# Altium footprint library 13-IC Packages-2smt2e.PcbLib: 86 footprints (part 2 of 6)
Each footprint in its own frame and in the unit in brackets; x right, y up, seen from the top. Pads: shape width x height; smd on the part's side, far side on the other; paste and mask are expansions set on the pad; w line width, h text height; cw(c..) or ccw(c..) is an arc to the next point about the centre after c.
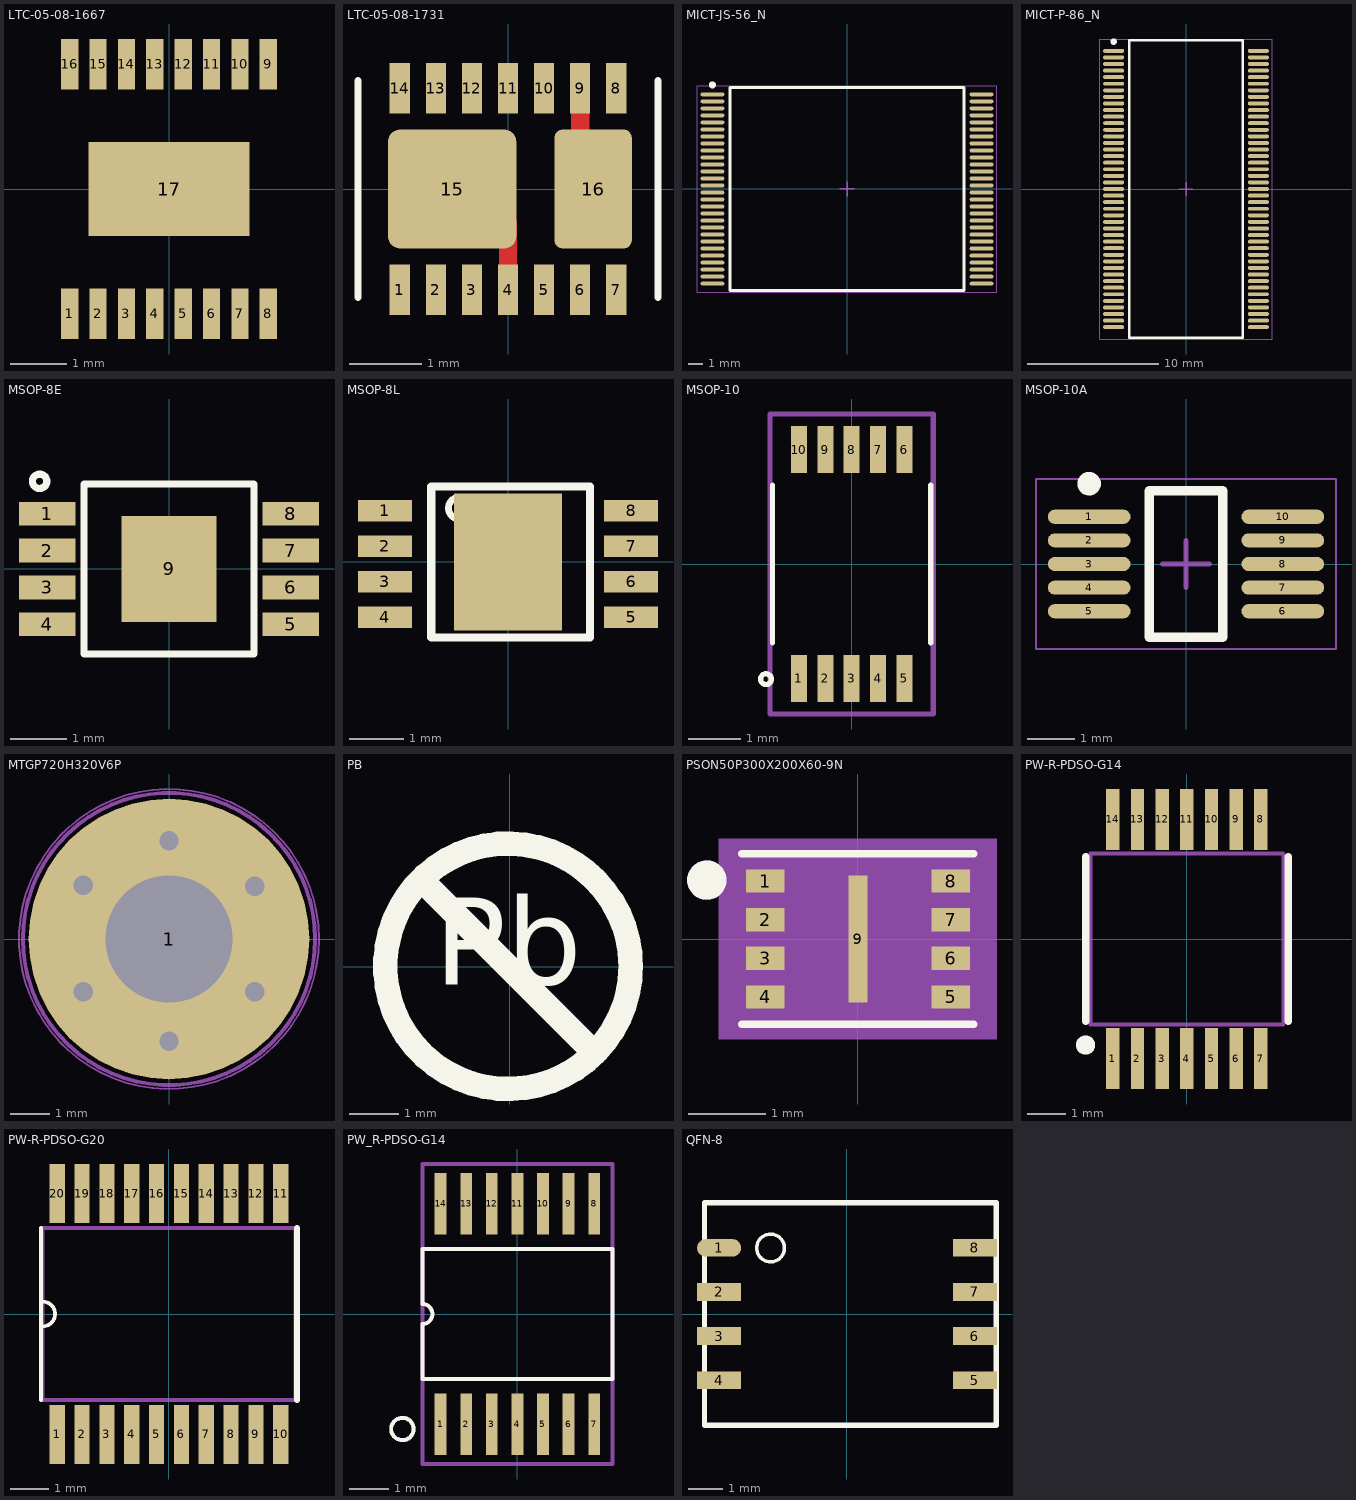
[diagram p1: the footprints below, top view; thin cyan lines are the x and y axes]

## LTC-05-08-1667 [mm] "LTC-3260"
pads (17):
  rect 0.305x0.889 smd mask+0.07: 1(-1.75,-2.2) 2(-1.25,-2.2) 3(-0.75,-2.2) 4(-0.25,-2.2) 5(0.25,-2.2) 6(0.75,-2.2) 7(1.25,-2.2) 8(1.75,-2.2) 9(1.75,2.2) 10(1.25,2.2) 11(0.75,2.2) 12(0.25,2.2) 13(-0.25,2.2) 14(-0.75,2.2) 15(-1.25,2.2) 16(-1.75,2.2)
  rect 2.845x1.651 smd: 17(0,0)
3D body "ltc-05-08-1667.stp": height 0.86, standoff 0, extent -1.968,-2.458 2.032,2.458

## LTC-05-08-1731 [mm]
pads (16):
  rect 0.28x0.7 smd mask+0.07: 1(-1.5,-1.4) 2(-1,-1.4) 3(-0.5,-1.4) 4(0,-1.4) 5(0.5,-1.4) 6(1,-1.4) 7(1.5,-1.4) 8(1.5,1.4) 9(1,1.4) 10(0.5,1.4) 11(0,1.4) 12(-0.5,1.4) 13(-1,1.4) 14(-1.5,1.4)
  rrect20% 1.78x1.65 smd mask+0.07: 15(-0.775,0)
  rrect20% 1.07x1.65 smd: 16(1.181,0)
Top Layer:
  lines w0.254: 0,-1.4 0,-0.47 ; 1,0.635 1,1.4
Top Overlay:
  lines w0.1: -2.08,-1.5 -2.08,1.5 ; 2.08,-1.5 2.08,1.5
3D body "lt3032pad.stp": height 0.02, standoff 0, extent -1.626,-1.753 -1.376,-1.253
3D body "lt3032pad.stp": height 0.02, standoff 0, extent -1.13,-1.753 -0.88,-1.253
3D body "lt3032pad.stp": height 0.02, standoff 0, extent -0.622,-1.753 -0.372,-1.253
3D body "lt3032pad.stp": height 0.02, standoff 0, extent -0.127,-1.753 0.123,-1.253
3D body "lt3032pad.stp": height 0.02, standoff 0, extent 0.381,-1.753 0.631,-1.253
3D body "lt3032pad.stp": height 0.02, standoff 0, extent 0.876,-1.753 1.126,-1.253
3D body "lt3032pad.stp": height 0.02, standoff 0, extent 1.372,-1.753 1.622,-1.253
3D body "lt3032pad.stp": height 0.02, standoff 0, extent 1.376,1.253 1.626,1.753
3D body "lt3032pad.stp": height 0.02, standoff 0, extent 0.868,1.253 1.118,1.753
3D body "lt3032pad.stp": height 0.02, standoff 0, extent 0.372,1.253 0.622,1.753
3D body "lt3032pad.stp": height 0.02, standoff 0, extent -0.123,1.253 0.127,1.753
3D body "lt3032pad.stp": height 0.02, standoff 0, extent -0.618,1.253 -0.368,1.753
3D body "lt3032pad.stp": height 0.02, standoff 0, extent -1.126,1.253 -0.876,1.753
3D body "lt3032pad.stp": height 0.02, standoff 0, extent -1.622,1.253 -1.372,1.753
3D body "lt3032.stp": height 0.8, standoff 0, extent -2,-1.524 2,1.492

## MICT-JS-56_N [mm]
pads (56):
  oval 1.7x0.28 smd: 1(-9.6,6.75) 2(-9.6,6.25) 3(-9.6,5.75) 4(-9.6,5.25) 5(-9.6,4.75) 6(-9.6,4.25) 7(-9.6,3.75) 8(-9.6,3.25) 9(-9.6,2.75) 10(-9.6,2.25) 11(-9.6,1.75) 12(-9.6,1.25) 13(-9.6,0.75) 14(-9.6,0.25) 15(-9.6,-0.25) 16(-9.6,-0.75) 17(-9.6,-1.25) 18(-9.6,-1.75) 19(-9.6,-2.25) 20(-9.6,-2.75) 21(-9.6,-3.25) 22(-9.6,-3.75) 23(-9.6,-4.25) 24(-9.6,-4.75) 25(-9.6,-5.25) 26(-9.6,-5.75) 27(-9.6,-6.25) 28(-9.6,-6.75) 29(9.6,-6.75) 30(9.6,-6.25) 31(9.6,-5.75) 32(9.6,-5.25) 33(9.6,-4.75) 34(9.6,-4.25) 35(9.6,-3.75) 36(9.6,-3.25) 37(9.6,-2.75) 38(9.6,-2.25) 39(9.6,-1.75) 40(9.6,-1.25) 41(9.6,-0.75) 42(9.6,-0.25) 43(9.6,0.25) 44(9.6,0.75) 45(9.6,1.25) 46(9.6,1.75) 47(9.6,2.25) 48(9.6,2.75) 49(9.6,3.25) 50(9.6,3.75) 51(9.6,4.25) 52(9.6,4.75) 53(9.6,5.25) 54(9.6,5.75) 55(9.6,6.25) 56(9.6,6.75)
Top Overlay:
  circle w0.25: c-9.6,7.425 r0.125
  lines w0.2: -8.35,-7.239 -8.35,7.239 8.35,7.239 8.35,-7.239 -8.35,-7.239
Mechanical 15:
  lines w0.05: -10.7,-7.35 -10.7,7.35 10.7,7.35 10.7,-7.35 -10.7,-7.35
  lines w0.1: -0.5,0 0.5,0 ; 0,-0.5 0,0.5
3D body "0_3-1_6.stp": height 0.01, standoff 0, extent 8.801,6.6 10.399,6.9
3D body "0_3-1_6.stp": height 0.01, standoff 0, extent 8.801,6.1 10.399,6.4
3D body "0_3-1_6.stp": height 0.01, standoff 0, extent 8.801,5.6 10.399,5.9
3D body "0_3-1_6.stp": height 0.01, standoff 0, extent 8.801,5.1 10.399,5.4
3D body "0_3-1_6.stp": height 0.01, standoff 0, extent 8.801,4.6 10.399,4.9
3D body "0_3-1_6.stp": height 0.01, standoff 0, extent 8.801,4.1 10.399,4.4
3D body "0_3-1_6.stp": height 0.01, standoff 0, extent 8.801,3.6 10.399,3.9
3D body "0_3-1_6.stp": height 0.01, standoff 0, extent 8.801,3.1 10.399,3.4
3D body "0_3-1_6.stp": height 0.01, standoff 0, extent 8.801,2.6 10.399,2.9
3D body "0_3-1_6.stp": height 0.01, standoff 0, extent 8.801,2.1 10.399,2.4
3D body "0_3-1_6.stp": height 0.01, standoff 0, extent 8.801,1.6 10.399,1.9
3D body "0_3-1_6.stp": height 0.01, standoff 0, extent 8.801,1.1 10.399,1.4
3D body "0_3-1_6.stp": height 0.01, standoff 0, extent 8.801,0.6 10.399,0.9
3D body "0_3-1_6.stp": height 0.01, standoff 0, extent 8.801,0.1 10.399,0.4
3D body "0_3-1_6.stp": height 0.01, standoff 0, extent 8.801,-0.4 10.399,-0.1
3D body "0_3-1_6.stp": height 0.01, standoff 0, extent 8.801,-0.9 10.399,-0.6
3D body "0_3-1_6.stp": height 0.01, standoff 0, extent 8.801,-1.4 10.399,-1.1
3D body "0_3-1_6.stp": height 0.01, standoff 0, extent 8.801,-1.9 10.399,-1.6
3D body "0_3-1_6.stp": height 0.01, standoff 0, extent 8.801,-2.4 10.399,-2.1
3D body "0_3-1_6.stp": height 0.01, standoff 0, extent 8.801,-2.9 10.399,-2.6
3D body "0_3-1_6.stp": height 0.01, standoff 0, extent 8.801,-3.4 10.399,-3.1
3D body "0_3-1_6.stp": height 0.01, standoff 0, extent 8.801,-3.9 10.399,-3.6
3D body "0_3-1_6.stp": height 0.01, standoff 0, extent 8.801,-4.4 10.399,-4.1
3D body "0_3-1_6.stp": height 0.01, standoff 0, extent 8.801,-4.9 10.399,-4.6
3D body "0_3-1_6.stp": height 0.01, standoff 0, extent 8.801,-5.4 10.399,-5.1
3D body "0_3-1_6.stp": height 0.01, standoff 0, extent 8.801,-5.9 10.399,-5.6
3D body "0_3-1_6.stp": height 0.01, standoff 0, extent 8.801,-6.4 10.399,-6.1
3D body "0_3-1_6.stp": height 0.01, standoff 0, extent 8.801,-6.9 10.399,-6.6
3D body "0_3-1_6.stp": height 0.01, standoff 0, extent -10.399,-6.9 -8.801,-6.6
3D body "0_3-1_6.stp": height 0.01, standoff 0, extent -10.399,-6.4 -8.801,-6.1
3D body "0_3-1_6.stp": height 0.01, standoff 0, extent -10.399,-5.9 -8.801,-5.6
3D body "0_3-1_6.stp": height 0.01, standoff 0, extent -10.399,-5.4 -8.801,-5.1
3D body "0_3-1_6.stp": height 0.01, standoff 0, extent -10.399,-4.9 -8.801,-4.6
3D body "0_3-1_6.stp": height 0.01, standoff 0, extent -10.399,-4.4 -8.801,-4.1
3D body "0_3-1_6.stp": height 0.01, standoff 0, extent -10.399,-3.9 -8.801,-3.6
3D body "0_3-1_6.stp": height 0.01, standoff 0, extent -10.399,-3.4 -8.801,-3.1
3D body "0_3-1_6.stp": height 0.01, standoff 0, extent -10.399,-2.9 -8.801,-2.6
3D body "0_3-1_6.stp": height 0.01, standoff 0, extent -10.399,-2.4 -8.801,-2.1
3D body "0_3-1_6.stp": height 0.01, standoff 0, extent -10.399,-1.9 -8.801,-1.6
3D body "0_3-1_6.stp": height 0.01, standoff 0, extent -10.399,-1.4 -8.801,-1.1
3D body "0_3-1_6.stp": height 0.01, standoff 0, extent -10.399,-0.9 -8.801,-0.6
3D body "0_3-1_6.stp": height 0.01, standoff 0, extent -10.399,-0.4 -8.801,-0.1
3D body "0_3-1_6.stp": height 0.01, standoff 0, extent -10.399,0.1 -8.801,0.4
3D body "0_3-1_6.stp": height 0.01, standoff 0, extent -10.399,0.6 -8.801,0.9
3D body "0_3-1_6.stp": height 0.01, standoff 0, extent -10.399,1.1 -8.801,1.4
3D body "0_3-1_6.stp": height 0.01, standoff 0, extent -10.399,1.6 -8.801,1.9
3D body "0_3-1_6.stp": height 0.01, standoff 0, extent -10.399,2.1 -8.801,2.4
3D body "0_3-1_6.stp": height 0.01, standoff 0, extent -10.399,2.6 -8.801,2.9
3D body "0_3-1_6.stp": height 0.01, standoff 0, extent -10.399,3.1 -8.801,3.4
3D body "0_3-1_6.stp": height 0.01, standoff 0, extent -10.399,3.6 -8.801,3.9
3D body "0_3-1_6.stp": height 0.01, standoff 0, extent -10.399,4.1 -8.801,4.4
3D body "0_3-1_6.stp": height 0.01, standoff 0, extent -10.399,4.6 -8.801,4.9
3D body "0_3-1_6.stp": height 0.01, standoff 0, extent -10.399,5.1 -8.801,5.4
3D body "0_3-1_6.stp": height 0.01, standoff 0, extent -10.399,5.6 -8.801,5.9
3D body "0_3-1_6.stp": height 0.01, standoff 0, extent -10.399,6.1 -8.801,6.4
3D body "0_3-1_6.stp": height 0.01, standoff 0, extent -10.399,6.6 -8.801,6.9
3D body "mict-p33256js-56.stp": height 1.01, standoff -0.03, extent -10.254,-7 10.254,7

## MICT-P-86_N [mm]
pads (86):
  oval 1.6x0.3 smd: 1(-5.5,10.5) 2(-5.5,10) 3(-5.5,9.5) 4(-5.5,9) 5(-5.5,8.5) 6(-5.5,8) 7(-5.5,7.5) 8(-5.5,7) 9(-5.5,6.5) 10(-5.5,6) 11(-5.5,5.5) 12(-5.5,5) 13(-5.5,4.5) 14(-5.5,4) 15(-5.5,3.5) 16(-5.5,3) 17(-5.5,2.5) 18(-5.5,2) 19(-5.5,1.5) 20(-5.5,1) 21(-5.5,0.5) 22(-5.5,0) 23(-5.5,-0.5) 24(-5.5,-1) 25(-5.5,-1.5) 26(-5.5,-2) 27(-5.5,-2.5) 28(-5.5,-3) 29(-5.5,-3.5) 30(-5.5,-4) 31(-5.5,-4.5) 32(-5.5,-5) 33(-5.5,-5.5) 34(-5.5,-6) 35(-5.5,-6.5) 36(-5.5,-7) 37(-5.5,-7.5) 38(-5.5,-8) 39(-5.5,-8.5) 40(-5.5,-9) 41(-5.5,-9.5) 42(-5.5,-10) 43(-5.5,-10.5) 44(5.5,-10.5) 45(5.5,-10) 46(5.5,-9.5) 47(5.5,-9) 48(5.5,-8.5) 49(5.5,-8) 50(5.5,-7.5) 51(5.5,-7) 52(5.5,-6.5) 53(5.5,-6) 54(5.5,-5.5) 55(5.5,-5) 56(5.5,-4.5) 57(5.5,-4) 58(5.5,-3.5) 59(5.5,-3) 60(5.5,-2.5) 61(5.5,-2) 62(5.5,-1.5) 63(5.5,-1) 64(5.5,-0.5) 65(5.5,0) 66(5.5,0.5) 67(5.5,1) 68(5.5,1.5) 69(5.5,2) 70(5.5,2.5) 71(5.5,3) 72(5.5,3.5) 73(5.5,4) 74(5.5,4.5) 75(5.5,5) 76(5.5,5.5) 77(5.5,6) 78(5.5,6.5) 79(5.5,7) 80(5.5,7.5) 81(5.5,8) 82(5.5,8.5) 83(5.5,9) 84(5.5,9.5) 85(5.5,10) 86(5.5,10.5)
Top Overlay:
  circle w0.25: c-5.5,11.2 r0.125
  lines w0.2: -4.3,-11.303 4.3,-11.303 4.3,11.303 -4.3,11.303 -4.3,-11.303
Mechanical 15:
  lines w0.05: -6.55,-11.4 6.55,-11.4 6.55,11.4 -6.55,11.4 -6.55,-11.4
  lines w0.1: -0.5,0 0.5,0 ; 0,-0.5 0,0.5
3D body "0_3-1_6.stp": height 0.01, standoff 0, extent 4.701,10.35 6.299,10.65
3D body "0_3-1_6.stp": height 0.01, standoff 0, extent 4.701,9.85 6.299,10.15
3D body "0_3-1_6.stp": height 0.01, standoff 0, extent 4.701,9.35 6.299,9.65
3D body "0_3-1_6.stp": height 0.01, standoff 0, extent 4.701,8.85 6.299,9.15
3D body "0_3-1_6.stp": height 0.01, standoff 0, extent 4.701,8.35 6.299,8.65
3D body "0_3-1_6.stp": height 0.01, standoff 0, extent 4.701,7.85 6.299,8.15
3D body "0_3-1_6.stp": height 0.01, standoff 0, extent 4.701,7.35 6.299,7.65
3D body "0_3-1_6.stp": height 0.01, standoff 0, extent 4.701,6.85 6.299,7.15
3D body "0_3-1_6.stp": height 0.01, standoff 0, extent 4.701,6.35 6.299,6.65
3D body "0_3-1_6.stp": height 0.01, standoff 0, extent 4.701,5.85 6.299,6.15
3D body "0_3-1_6.stp": height 0.01, standoff 0, extent 4.701,5.35 6.299,5.65
3D body "0_3-1_6.stp": height 0.01, standoff 0, extent 4.701,4.85 6.299,5.15
3D body "0_3-1_6.stp": height 0.01, standoff 0, extent 4.701,4.35 6.299,4.65
3D body "0_3-1_6.stp": height 0.01, standoff 0, extent 4.701,3.85 6.299,4.15
3D body "0_3-1_6.stp": height 0.01, standoff 0, extent 4.701,3.35 6.299,3.65
3D body "0_3-1_6.stp": height 0.01, standoff 0, extent 4.701,2.85 6.299,3.15
3D body "0_3-1_6.stp": height 0.01, standoff 0, extent 4.701,2.35 6.299,2.65
3D body "0_3-1_6.stp": height 0.01, standoff 0, extent 4.701,1.85 6.299,2.15
3D body "0_3-1_6.stp": height 0.01, standoff 0, extent 4.701,1.35 6.299,1.65
3D body "0_3-1_6.stp": height 0.01, standoff 0, extent 4.701,0.85 6.299,1.15
3D body "0_3-1_6.stp": height 0.01, standoff 0, extent 4.701,0.35 6.299,0.65
3D body "0_3-1_6.stp": height 0.01, standoff 0, extent 4.701,-0.15 6.299,0.15
3D body "0_3-1_6.stp": height 0.01, standoff 0, extent 4.701,-0.65 6.299,-0.35
3D body "0_3-1_6.stp": height 0.01, standoff 0, extent 4.701,-1.15 6.299,-0.85
3D body "0_3-1_6.stp": height 0.01, standoff 0, extent 4.701,-1.65 6.299,-1.35
3D body "0_3-1_6.stp": height 0.01, standoff 0, extent 4.701,-2.15 6.299,-1.85
3D body "0_3-1_6.stp": height 0.01, standoff 0, extent 4.701,-2.65 6.299,-2.35
3D body "0_3-1_6.stp": height 0.01, standoff 0, extent 4.701,-3.15 6.299,-2.85
3D body "0_3-1_6.stp": height 0.01, standoff 0, extent 4.701,-3.65 6.299,-3.35
3D body "0_3-1_6.stp": height 0.01, standoff 0, extent 4.701,-4.15 6.299,-3.85
3D body "0_3-1_6.stp": height 0.01, standoff 0, extent 4.701,-4.65 6.299,-4.35
3D body "0_3-1_6.stp": height 0.01, standoff 0, extent 4.701,-5.15 6.299,-4.85
3D body "0_3-1_6.stp": height 0.01, standoff 0, extent 4.701,-5.65 6.299,-5.35
3D body "0_3-1_6.stp": height 0.01, standoff 0, extent 4.701,-6.15 6.299,-5.85
3D body "0_3-1_6.stp": height 0.01, standoff 0, extent 4.701,-6.65 6.299,-6.35
3D body "0_3-1_6.stp": height 0.01, standoff 0, extent 4.701,-7.15 6.299,-6.85
3D body "0_3-1_6.stp": height 0.01, standoff 0, extent 4.701,-7.65 6.299,-7.35
3D body "0_3-1_6.stp": height 0.01, standoff 0, extent 4.701,-8.15 6.299,-7.85
3D body "0_3-1_6.stp": height 0.01, standoff 0, extent 4.701,-8.65 6.299,-8.35
3D body "0_3-1_6.stp": height 0.01, standoff 0, extent 4.701,-9.15 6.299,-8.85
3D body "0_3-1_6.stp": height 0.01, standoff 0, extent 4.701,-9.65 6.299,-9.35
3D body "0_3-1_6.stp": height 0.01, standoff 0, extent 4.701,-10.15 6.299,-9.85
3D body "0_3-1_6.stp": height 0.01, standoff 0, extent 4.701,-10.65 6.299,-10.35
3D body "0_3-1_6.stp": height 0.01, standoff 0, extent -6.299,-10.65 -4.701,-10.35
3D body "0_3-1_6.stp": height 0.01, standoff 0, extent -6.299,-10.15 -4.701,-9.85
3D body "0_3-1_6.stp": height 0.01, standoff 0, extent -6.299,-9.65 -4.701,-9.35
3D body "0_3-1_6.stp": height 0.01, standoff 0, extent -6.299,-9.15 -4.701,-8.85
3D body "0_3-1_6.stp": height 0.01, standoff 0, extent -6.299,-8.65 -4.701,-8.35
3D body "0_3-1_6.stp": height 0.01, standoff 0, extent -6.299,-8.15 -4.701,-7.85
3D body "0_3-1_6.stp": height 0.01, standoff 0, extent -6.299,-7.65 -4.701,-7.35
3D body "0_3-1_6.stp": height 0.01, standoff 0, extent -6.299,-7.15 -4.701,-6.85
3D body "0_3-1_6.stp": height 0.01, standoff 0, extent -6.299,-6.65 -4.701,-6.35
3D body "0_3-1_6.stp": height 0.01, standoff 0, extent -6.299,-6.15 -4.701,-5.85
3D body "0_3-1_6.stp": height 0.01, standoff 0, extent -6.299,-5.65 -4.701,-5.35
3D body "0_3-1_6.stp": height 0.01, standoff 0, extent -6.299,-5.15 -4.701,-4.85
3D body "0_3-1_6.stp": height 0.01, standoff 0, extent -6.299,-4.65 -4.701,-4.35
3D body "0_3-1_6.stp": height 0.01, standoff 0, extent -6.299,-4.15 -4.701,-3.85
3D body "0_3-1_6.stp": height 0.01, standoff 0, extent -6.299,-3.65 -4.701,-3.35
3D body "0_3-1_6.stp": height 0.01, standoff 0, extent -6.299,-3.15 -4.701,-2.85
3D body "0_3-1_6.stp": height 0.01, standoff 0, extent -6.299,-2.65 -4.701,-2.35
3D body "0_3-1_6.stp": height 0.01, standoff 0, extent -6.299,-2.15 -4.701,-1.85
3D body "0_3-1_6.stp": height 0.01, standoff 0, extent -6.299,-1.65 -4.701,-1.35
3D body "0_3-1_6.stp": height 0.01, standoff 0, extent -6.299,-1.15 -4.701,-0.85
3D body "0_3-1_6.stp": height 0.01, standoff 0, extent -6.299,-0.65 -4.701,-0.35
3D body "0_3-1_6.stp": height 0.01, standoff 0, extent -6.299,-0.15 -4.701,0.15
3D body "0_3-1_6.stp": height 0.01, standoff 0, extent -6.299,0.35 -4.701,0.65
3D body "0_3-1_6.stp": height 0.01, standoff 0, extent -6.299,0.85 -4.701,1.15
3D body "0_3-1_6.stp": height 0.01, standoff 0, extent -6.299,1.35 -4.701,1.65
3D body "0_3-1_6.stp": height 0.01, standoff 0, extent -6.299,1.85 -4.701,2.15
3D body "0_3-1_6.stp": height 0.01, standoff 0, extent -6.299,2.35 -4.701,2.65
3D body "0_3-1_6.stp": height 0.01, standoff 0, extent -6.299,2.85 -4.701,3.15
3D body "0_3-1_6.stp": height 0.01, standoff 0, extent -6.299,3.35 -4.701,3.65
3D body "0_3-1_6.stp": height 0.01, standoff 0, extent -6.299,3.85 -4.701,4.15
3D body "0_3-1_6.stp": height 0.01, standoff 0, extent -6.299,4.35 -4.701,4.65
3D body "0_3-1_6.stp": height 0.01, standoff 0, extent -6.299,4.85 -4.701,5.15
3D body "0_3-1_6.stp": height 0.01, standoff 0, extent -6.299,5.35 -4.701,5.65
3D body "0_3-1_6.stp": height 0.01, standoff 0, extent -6.299,5.85 -4.701,6.15
3D body "0_3-1_6.stp": height 0.01, standoff 0, extent -6.299,6.35 -4.701,6.65
3D body "0_3-1_6.stp": height 0.01, standoff 0, extent -6.299,6.85 -4.701,7.15
3D body "0_3-1_6.stp": height 0.01, standoff 0, extent -6.299,7.35 -4.701,7.65
3D body "0_3-1_6.stp": height 0.01, standoff 0, extent -6.299,7.85 -4.701,8.15
3D body "0_3-1_6.stp": height 0.01, standoff 0, extent -6.299,8.35 -4.701,8.65
3D body "0_3-1_6.stp": height 0.01, standoff 0, extent -6.299,8.85 -4.701,9.15
3D body "0_3-1_6.stp": height 0.01, standoff 0, extent -6.299,9.35 -4.701,9.65
3D body "0_3-1_6.stp": height 0.01, standoff 0, extent -6.299,9.85 -4.701,10.15
3D body "0_3-1_6.stp": height 0.01, standoff 0, extent -6.299,10.35 -4.701,10.65
3D body "mt48lc4m32b2p-ddr2.stp": height 1.21, standoff -0.01, extent -5.88,-11.11 5.88,11.11

## MSOP-8E [mm]
pads (9):
  rect 1x0.42 smd mask+0.051: 1(-2.15,0.975) 2(-2.15,0.325) 3(-2.15,-0.325) 5(2.15,-0.975) 6(2.15,-0.325) 7(2.15,0.325) 8(2.15,0.975)
  rect 1x0.42 smd mask+0.07: 4(-2.15,-0.975)
  rect 1.68x1.88 smd mask+0: 9(0,0)
Top Overlay:
  circle w0.127: c-2.286,1.549 r0.127
  lines w0.127: -1.5,-1.5 1.5,-1.5 1.5,1.5 -1.5,1.5 -1.5,-1.5
3D body "msop8e-pad.stp": height 0, standoff 0, extent 1.641,-1.197 2.641,-0.772
3D body "msop8e-pad.stp": height 0, standoff 0, extent 1.641,-0.547 2.641,-0.122
3D body "msop8e-pad.stp": height 0, standoff 0, extent 1.641,0.103 2.641,0.528
3D body "msop8e-pad.stp": height 0, standoff 0, extent 1.641,0.753 2.641,1.178
3D body "msop8e-pad.stp": height 0, standoff 0, extent -2.659,-1.197 -1.659,-0.772
3D body "msop8e-pad.stp": height 0, standoff 0, extent -2.659,-0.547 -1.659,-0.122
3D body "msop8e-pad.stp": height 0, standoff 0, extent -2.659,0.103 -1.659,0.528
3D body "msop8e-pad.stp": height 0, standoff 0, extent -2.659,0.753 -1.659,1.178
3D body "ms0p-8l.stp": height 1.1, standoff 0.03, extent -2.45,-1.5 2.45,1.5

## MSOP-8L [mm]
pads (9):
  rect 1x0.4 smd mask+0.051: 1(-2.286,0.953) 2(-2.286,0.293) 3(-2.286,-0.367) 5(2.286,-1.028) 6(2.286,-0.367) 7(2.286,0.293) 8(2.286,0.953)
  rect 1x0.4 smd mask+0: 4(-2.286,-1.028)
  rect 2x2.54 smd mask+0: ""(0,0)
Top Overlay:
  circle w0.127: c-0.903,1 r0.203
  lines w0.152: -1.425,-1.4 1.521,-1.4 1.521,1.4 -1.425,1.4 -1.425,-1.4
3D body "ms0p-8l.stp": height 1.1, standoff 0.03, extent -2.45,-1.5 2.45,1.5

## MSOP-10 [mm] "LTC4356"
pads (10):
  rect 0.305x0.889 smd: 1(-1,-2.17) 2(-0.5,-2.17) 3(0,-2.17) 4(0.5,-2.17) 6(1,2.17) 7(0.5,2.17) 8(0,2.17) 9(-0.5,2.17) 10(-1,2.17)
  rect 0.305x0.889 smd mask+0.05: 5(1,-2.17)
Top Overlay:
  circle w0.1: c-1.626,-2.184 r0.102
  lines w0.1: -1.5,-1.5 -1.5,1.5 ; 1.5,-1.5 1.5,1.5
Mechanical 11:
  lines w0.1: -1.549,-2.845 -1.549,2.845 1.549,2.845 1.549,-2.845 -1.549,-2.845
3D body "0_305-0_889.stp": height 0.02, standoff 0, extent 0.848,-2.614 1.153,-1.725
3D body "0_305-0_889.stp": height 0.02, standoff 0, extent 0.348,-2.614 0.653,-1.725
3D body "0_305-0_889.stp": height 0.02, standoff 0, extent -0.152,-2.614 0.153,-1.725
3D body "0_305-0_889.stp": height 0.02, standoff 0, extent -0.652,-2.614 -0.347,-1.725
3D body "0_305-0_889.stp": height 0.02, standoff 0, extent -1.152,-2.614 -0.847,-1.725
3D body "0_305-0_889.stp": height 0.02, standoff 0, extent 0.848,1.726 1.153,2.615
3D body "0_305-0_889.stp": height 0.02, standoff 0, extent 0.348,1.726 0.653,2.615
3D body "0_305-0_889.stp": height 0.02, standoff 0, extent -0.152,1.726 0.153,2.615
3D body "0_305-0_889.stp": height 0.02, standoff 0, extent -0.652,1.726 -0.347,2.615
3D body "0_305-0_889.stp": height 0.02, standoff 0, extent -1.152,1.726 -0.847,2.615
3D body "msop-10.stp": height 1.1, standoff 0, extent -1.5,-2.4 1.5,2.4

## MSOP-10A [mm]
pads (10):
  oval 1.75x0.3 smd mask+0.076: 1(-2.05,1) 2(-2.05,0.5) 3(-2.05,0) 4(-2.05,-0.5) 5(-2.05,-1) 6(2.05,-1) 7(2.05,-0.5) 8(2.05,0) 9(2.05,0.5) 10(2.05,1)
Top Overlay:
  circle w0.25: c-2.05,1.7 r0.125
  lines w0.2: -0.775,-1.55 -0.775,1.55 0.775,1.55 0.775,-1.55 -0.775,-1.55
Mechanical 15:
  lines w0.05: -3.175,-1.8 -3.175,1.8 3.175,1.8 3.175,-1.8 -3.175,-1.8
  lines w0.1: -0.5,0 0.5,0 ; 0,-0.5 0,0.5
3D body "ms0p010_rm-10.stp": height 1.1, standoff -0.04, extent -2.55,-1.55 2.55,1.55
3D body "0_3-1_75.stp": height 0.02, standoff 0, extent -2.925,0.85 -1.175,1.15
3D body "0_3-1_75.stp": height 0.02, standoff 0, extent -2.925,0.35 -1.175,0.65
3D body "0_3-1_75.stp": height 0.02, standoff 0, extent -2.925,-0.15 -1.175,0.15
3D body "0_3-1_75.stp": height 0.02, standoff 0, extent -2.925,-0.65 -1.175,-0.35
3D body "0_3-1_75.stp": height 0.02, standoff 0, extent -2.925,-1.15 -1.175,-0.85
3D body "0_3-1_75.stp": height 0.02, standoff 0, extent 1.175,0.85 2.925,1.15
3D body "0_3-1_75.stp": height 0.02, standoff 0, extent 1.175,0.35 2.925,0.65
3D body "0_3-1_75.stp": height 0.02, standoff 0, extent 1.175,-0.15 2.925,0.15
3D body "0_3-1_75.stp": height 0.02, standoff 0, extent 1.175,-0.65 2.925,-0.35
3D body "0_3-1_75.stp": height 0.02, standoff 0, extent 1.175,-1.15 2.925,-0.85

## MTGP720H320V6P [mm]
pads (1):
  round 7.2 hole 3.25: 1(0,0)
via -2.2,-1.35 diameter 1 hole 0.5
via -2.2,1.375 diameter 1 hole 0.5
via 0,2.525 diameter 1 hole 0.5
via 2.2,1.35 diameter 1 hole 0.5
via 0,-2.625 diameter 1 hole 0.5
via 2.2,-1.35 diameter 1 hole 0.5
Mechanical 8:
  circle w0.1: c0,0 r2.6
  circle w0.1: c0,0 r3.75
  lines w0.1: -2.657,1.625 -2.224,1.375 ; -2.632,-1.6 -2.199,-1.35 ; -2.474,0.942 -2.224,1.375 ; -2.449,-0.917 -2.199,-1.35 ; -1.974,1.808 -2.224,1.375 ; -1.949,-1.783 -2.199,-1.35 ; -1.791,1.125 -2.224,1.375 ; -1.766,-1.1 -2.199,-1.35 ; -0.5,-2.625 0,-2.625 ; -0.5,0 0,0 ; -0.5,2.525 0,2.525 ; 0,-3.125 0,-2.625 ; 0,-2.125 0,-2.625 ; 0,-0.5 0,0 ; 0,0.5 0,0 ; 0,2.025 0,2.525 ; 0,3.025 0,2.525 ; 0.5,-2.625 0,-2.625 ; 0.5,0 0,0 ; 0.5,2.525 0,2.525 ; 1.766,-1.1 2.199,-1.35 ; 1.766,1.1 2.199,1.35 ; 1.949,-1.783 2.199,-1.35 ; 1.949,1.783 2.199,1.35 ; 2.449,-0.917 2.199,-1.35 ; 2.449,0.917 2.199,1.35 ; 2.632,-1.6 2.199,-1.35 ; 2.632,1.6 2.199,1.35
Mechanical 14:
  circle w0.1: c0,0 r3.75
Mechanical 15:
  circle w0.05: c0,0 r3.85
3D body "mtgp720h320v6p.stp": height 0.1, standoff -1.75, extent -3.627,-3.627 3.628,3.628

## PB [mm]
Top Overlay:
  circle w0.5: c-0.031,0.013 r2.5
  lines w0.5: -1.737,1.719 1.675,-1.693
  text "Pb" at -1.536,-0.948 h3.05
3D body "pb.stp": height 0.02, standoff 0, extent -2.725,-2.725 2.725,2.725

## PCBComponent_1 - duplicate [mm]

## PSON50P300X200X60-9N [mm] "PSON50P300X200X60-9N"
pads (9):
  rect 0.5x0.3 smd: 1(-1.2,0.75) 2(-1.2,0.25) 3(-1.2,-0.25) 4(-1.2,-0.75) 5(1.2,-0.75) 6(1.2,-0.25) 7(1.2,0.25) 8(1.2,0.75)
  rect 0.25x1.65 smd: 9(0,0)
Top Overlay:
  circle w0.254: c-1.956,0.762 r0.127
  lines w0.1: -1.5,-1.103 1.5,-1.103 ; -1.5,1.103 1.5,1.103
Mechanical 16:
  circle w0.254: c-1.956,0.762 r0.127
  region: -1.8,-1.3 -1.8,1.3 1.8,1.3 1.8,-1.3
  lines w0.025: -1.5,-1 -1.5,1 1.5,1 1.5,-1 -1.5,-1
Mechanical 32:
  text "4" at -1.505,-0.75 h0.76
  text "9" at -0.305,0 h0.76
  text "7" at 0.895,0.25 h0.76
  text "3" at -1.505,-0.25 h0.76
  text "5" at 0.895,-0.75 h0.76
  text "2" at -1.505,0.25 h0.76
  text "6" at 0.895,-0.25 h0.76
3D body "uson-8-2x3.stp": height 0.6, standoff 0, extent -1.5,-1 1.5,1

## PW-R-PDSO-G14 [mm]
pads (14):
  rect 0.35x1.6 smd mask+0.07: 1(-1.95,-3.15) 2(-1.3,-3.15) 3(-0.65,-3.15) 4(0,-3.15) 5(0.65,-3.15) 6(1.3,-3.15) 8(1.95,3.15) 9(1.3,3.15) 10(0.65,3.15) 11(0,3.15) 12(-0.65,3.15) 13(-1.3,3.15) 14(-1.95,3.15)
  rect 0.35x1.6 smd: 7(1.95,-3.15)
Top Overlay:
  circle w0.254: c-2.667,-2.794 r0.127
  lines w0.2: -2.667,-2.159 -2.667,2.159 ; 2.667,-2.159 2.667,2.159
Mechanical 1:
Mechanical 15:
  lines w0.1: -2.54,-2.25 2.54,-2.25 2.54,2.25 -2.54,2.25 -2.54,-2.25
3D body "0_35-1_6.stp": height 0.02, standoff 0, extent -2.125,-3.95 -1.775,-2.35
3D body "0_35-1_6.stp": height 0.02, standoff 0, extent -1.475,-3.95 -1.125,-2.35
3D body "0_35-1_6.stp": height 0.02, standoff 0, extent -0.825,-3.95 -0.475,-2.35
3D body "0_35-1_6.stp": height 0.02, standoff 0, extent -0.175,-3.95 0.175,-2.35
3D body "0_35-1_6.stp": height 0.02, standoff 0, extent 0.475,-3.95 0.825,-2.35
3D body "0_35-1_6.stp": height 0.02, standoff 0, extent 1.125,-3.95 1.475,-2.35
3D body "0_35-1_6.stp": height 0.02, standoff 0, extent 1.775,-3.95 2.125,-2.35
3D body "0_35-1_6.stp": height 0.02, standoff 0, extent -2.125,2.35 -1.775,3.95
3D body "0_35-1_6.stp": height 0.02, standoff 0, extent -1.475,2.35 -1.125,3.95
3D body "0_35-1_6.stp": height 0.02, standoff 0, extent -0.825,2.35 -0.475,3.95
3D body "0_35-1_6.stp": height 0.02, standoff 0, extent -0.175,2.35 0.175,3.95
3D body "0_35-1_6.stp": height 0.02, standoff 0, extent 0.475,2.35 0.825,3.95
3D body "0_35-1_6.stp": height 0.02, standoff 0, extent 1.125,2.35 1.475,3.95
3D body "0_35-1_6.stp": height 0.02, standoff 0, extent 1.775,2.35 2.125,3.95
3D body "so-g14.stp": height 1.2, standoff 0.01, extent -2.55,-3.279 2.55,3.279

## PW-R-PDSO-G20 [mm]
pads (20):
  rect 0.4x1.55 smd mask+0.07: 1(-2.925,-3.15) 2(-2.275,-3.15) 3(-1.625,-3.15) 4(-0.975,-3.15) 5(-0.325,-3.15) 6(0.325,-3.15) 7(0.975,-3.15) 8(1.625,-3.15) 9(2.275,-3.15) 10(2.925,-3.15) 11(2.925,3.15) 12(2.275,3.15) 13(1.625,3.15) 14(0.975,3.15) 15(0.325,3.15) 16(-0.325,3.15) 17(-0.975,3.15) 18(-1.625,3.15) 19(-2.275,3.15)
  rect 0.4x1.55 smd: 20(-2.925,3.15)
Top Overlay:
  lines w0.1: -3.35,-2.25 -3.35,2.25 ; -3.311,0.321 cw(c-3.302,0) -3.31,-0.322
  lines w0.152: 3.35,-2.25 3.35,2.25
Mechanical 15:
  lines w0.1: -3.302,-2.25 -3.302,2.25 3.302,2.25 3.302,-2.25 -3.302,-2.25
3D body "0_35-1_6.stp": height 0.02, standoff 0, extent 2.75,-3.95 3.1,-2.35
3D body "0_35-1_6.stp": height 0.02, standoff 0, extent 2.1,-3.95 2.45,-2.35
3D body "0_35-1_6.stp": height 0.02, standoff 0, extent 1.45,-3.95 1.8,-2.35
3D body "0_35-1_6.stp": height 0.02, standoff 0, extent 0.8,-3.95 1.15,-2.35
3D body "0_35-1_6.stp": height 0.02, standoff 0, extent 0.15,-3.95 0.5,-2.35
3D body "0_35-1_6.stp": height 0.02, standoff 0, extent -0.5,-3.95 -0.15,-2.35
3D body "0_35-1_6.stp": height 0.02, standoff 0, extent -1.15,-3.95 -0.8,-2.35
3D body "0_35-1_6.stp": height 0.02, standoff 0, extent -1.8,-3.95 -1.45,-2.35
3D body "0_35-1_6.stp": height 0.02, standoff 0, extent -2.45,-3.95 -2.1,-2.35
3D body "0_35-1_6.stp": height 0.02, standoff 0, extent -3.1,-3.95 -2.75,-2.35
3D body "0_35-1_6.stp": height 0.02, standoff 0, extent 2.75,2.35 3.1,3.95
3D body "0_35-1_6.stp": height 0.02, standoff 0, extent 2.1,2.35 2.45,3.95
3D body "0_35-1_6.stp": height 0.02, standoff 0, extent 1.45,2.35 1.8,3.95
3D body "0_35-1_6.stp": height 0.02, standoff 0, extent 0.8,2.35 1.15,3.95
3D body "0_35-1_6.stp": height 0.02, standoff 0, extent 0.15,2.35 0.5,3.95
3D body "0_35-1_6.stp": height 0.02, standoff 0, extent -0.5,2.35 -0.15,3.95
3D body "0_35-1_6.stp": height 0.02, standoff 0, extent -1.15,2.35 -0.8,3.95
3D body "0_35-1_6.stp": height 0.02, standoff 0, extent -1.8,2.35 -1.45,3.95
3D body "0_35-1_6.stp": height 0.02, standoff 0, extent -2.45,2.35 -2.1,3.95
3D body "0_35-1_6.stp": height 0.02, standoff 0, extent -3.1,2.35 -2.75,3.95
3D body "pw-r-pdso-g20.stp": height 1.2, standoff 0.04, extent -3.3,-3.3 3.3,3.3

## PW_R-PDSO-G14 [mm] "Ti"
pads (14):
  rect 0.3x1.555 smd mask+0.07: 1(-1.95,-2.8) 2(-1.3,-2.8) 3(-0.65,-2.8) 4(0,-2.8) 5(0.65,-2.8) 6(1.3,-2.8) 7(1.95,-2.8) 8(1.95,2.8) 9(1.3,2.8) 10(0.65,2.8) 11(0,2.8) 12(-0.65,2.8) 13(-1.3,2.8) 14(-1.95,2.8)
Top Overlay:
  circle w0.1: c-2.921,-2.921 r0.284
  lines w0.1: -2.413,-1.651 2.413,-1.651 2.413,1.651 -2.413,1.651 -2.413,0.254 cw(c-2.413,0) -2.413,-0.254 -2.413,-1.651
Mechanical 11:
  circle w0.1: c-2.921,-2.921 r0.284
  lines w0.1: -2.413,-3.81 2.413,-3.81 2.413,3.81 -2.413,3.81 -2.413,1.905 -2.413,-1.905 -2.413,-3.81
3D body "so-g14.stp": height 1.2, standoff 0.01, extent -2.55,-3.279 2.55,3.279
3D body "0_35-1_6.stp": height 0.02, standoff 0, extent -2.125,-3.6 -1.775,-2
3D body "0_35-1_6.stp": height 0.02, standoff 0, extent -1.475,-3.6 -1.125,-2
3D body "0_35-1_6.stp": height 0.02, standoff 0, extent -0.825,-3.6 -0.475,-2
3D body "0_35-1_6.stp": height 0.02, standoff 0, extent -0.175,-3.6 0.175,-2
3D body "0_35-1_6.stp": height 0.02, standoff 0, extent 0.475,-3.6 0.825,-2
3D body "0_35-1_6.stp": height 0.02, standoff 0, extent 1.125,-3.6 1.475,-2
3D body "0_35-1_6.stp": height 0.02, standoff 0, extent 1.775,-3.6 2.125,-2
3D body "0_35-1_6.stp": height 0.02, standoff 0, extent -2.125,2 -1.775,3.6
3D body "0_35-1_6.stp": height 0.02, standoff 0, extent -1.475,2 -1.125,3.6
3D body "0_35-1_6.stp": height 0.02, standoff 0, extent -0.825,2 -0.475,3.6
3D body "0_35-1_6.stp": height 0.02, standoff 0, extent -0.175,2 0.175,3.6
3D body "0_35-1_6.stp": height 0.02, standoff 0, extent 1.125,2 1.475,3.6
3D body "0_35-1_6.stp": height 0.02, standoff 0, extent 1.775,2 2.125,3.6
3D body "0_35-1_6.stp": height 0.02, standoff 0, extent 0.475,2 0.825,3.6

## QFN-8 [mil]
pads (8):
  oval 50x20 smd mask+2: 1(-145,75)
  rect 50x20 smd mask+2: 2(-145,25) 3(-145,-25) 5(145,-75) 6(145,-25) 7(145,25) 8(145,75)
  rect 50x20 smd mask+0: 4(-145,-75)
Top Overlay:
  circle w3.94: c-86.61,74.8 r15.75
  lines w6: -161.42,-125.98 169.29,-125.98 169.29,125.98 -89.52,125.98 -161.42,125.98 -161.42,-125.98
3D body "qfn-8t.stp": height 29.53, standoff -0.39, extent -154.33,-118.11 161.42,118.11